# Altium footprint library B105ic.PcbLib: 84 footprints (part 1 of 6)
Each footprint in its own frame and in the unit in brackets; x right, y up, seen from the top. Pads: shape width x height; smd on the part's side, far side on the other; paste and mask are expansions set on the pad; w line width, h text height; cw(c..) or ccw(c..) is an arc to the next point about the centre after c.
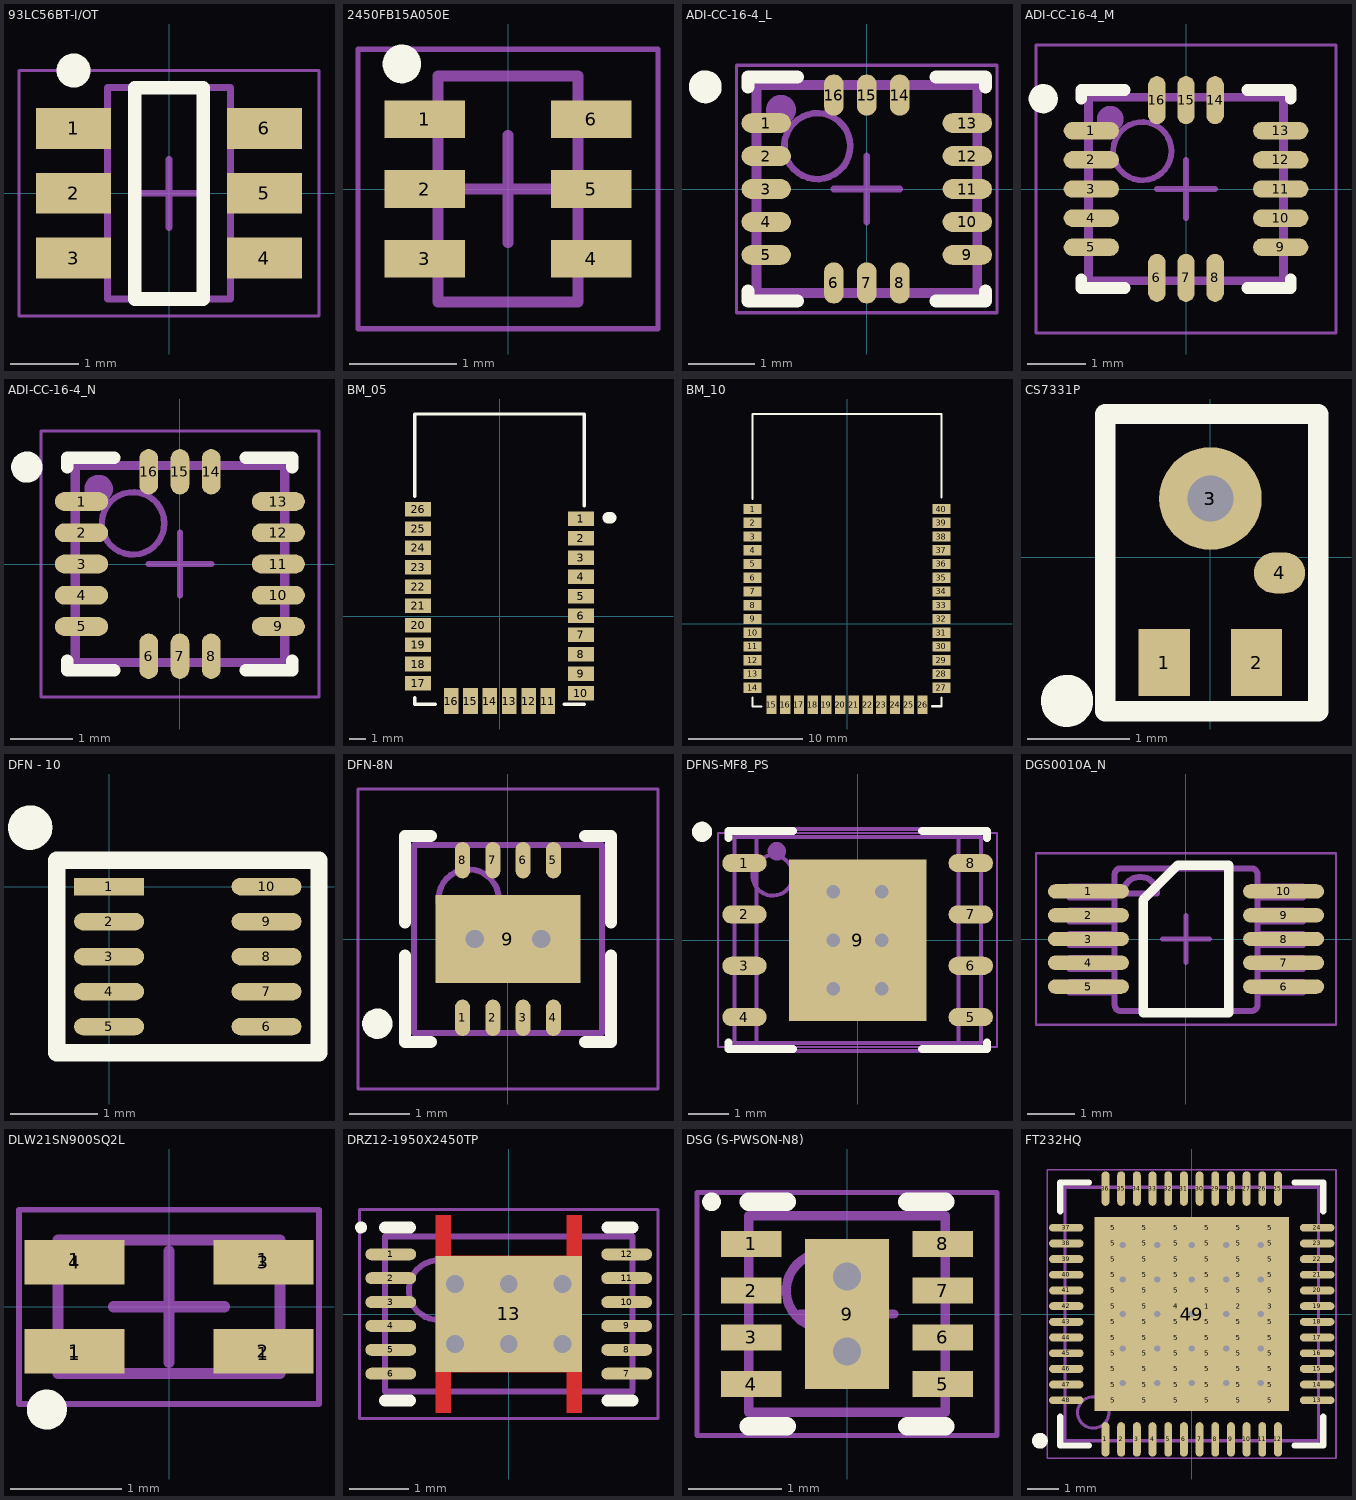
[diagram p0: the footprints below, top view; thin cyan lines are the x and y axes]

## 93LC56BT-I/OT [mm] "SOT23, 6-Leads, Body 2,90x2,70mm, Pitch 0,95mm, IPC Medium Density"
height 1.45
pads (6):
  rect 1.1x0.6 smd: 1(-1.4,0.95) 2(-1.4,0) 3(-1.4,-0.95) 4(1.4,-0.95) 5(1.4,0) 6(1.4,0.95)
Top Overlay:
  circle w0.25: c-1.4,1.8 r0.125
  lines w0.2: -0.5,-1.55 -0.5,1.55 0.5,1.55 0.5,-1.55 -0.5,-1.55
Mechanical 13:
  lines w0.1: -0.9,-1.55 0.9,-1.55 0.9,1.55 -0.9,1.55 -0.9,-1.55
Mechanical 15:
  lines w0.05: -2.2,-1.8 2.2,-1.8 2.2,1.8 -2.2,1.8 -2.2,-1.8
  lines w0.1: -0.5,0 0.5,0 ; 0,-0.5 0,0.5
3D body "93LC56BT-I-OT.step": height 1.45, standoff 0, extent -1.4,-1.45 1.4,1.45

## 2450FB15A050E [mm] "Chip Array, Flat, 6-Leads, Pitch 0,65mm,  Body 2,00x1,25mm,  IPC Medium Density"
height 1.05
pads (6):
  rect 0.75x0.35 smd: 1(-0.775,0.65) 2(-0.775,0) 3(-0.775,-0.65) 4(0.775,-0.65) 5(0.775,0) 6(0.775,0.65)
Top Overlay:
  circle w0.2: c-0.987,1.163 r0.08
Mechanical 13:
  lines w0.1: -0.65,-1.05 -0.65,1.05 0.65,1.05 0.65,-1.05 -0.65,-1.05
Mechanical 15:
  lines w0.05: -1.395,-1.3 -1.395,1.3 1.395,1.3 1.395,-1.3 -1.395,-1.3
  lines w0.1: -0.5,0 0.5,0 ; 0,-0.5 0,0.5
3D body "2450FB15A050E.step": height 0.8, standoff 0, extent -0.625,-1 0.625,1

## ADI-CC-16-4_L [mm] "QFN, 16-Leads, Body 3.25x3mm, Pitch 0.5mm, IPC High Density"
height 1.14
pads (16):
  oval 0.75x0.3 smd: 1(-1.525,1) 2(-1.525,0.5) 3(-1.525,0) 4(-1.525,-0.5) 5(-1.525,-1) 9(1.525,-1) 10(1.525,-0.5) 11(1.525,0) 12(1.525,0.5) 13(1.525,1)
  oval 0.3x0.625 smd: 6(-0.5,-1.425) 7(0,-1.425) 8(0.5,-1.425) 14(0.5,1.425) 15(0,1.425) 16(-0.5,1.425)
Top Overlay:
  circle w0.25: c-2.45,1.55 r0.125
  lines w0.2: -1.8,-1.55 -1.8,-1.7 -1.05,-1.7 ; -1.8,1.55 -1.8,1.7 -1.05,1.7 ; 1.05,-1.7 1.8,-1.7 1.8,-1.55 ; 1.05,1.7 1.8,1.7 1.8,1.55
Mechanical 5:
  circle w0.254: c-1.3,1.2 r0.1
  lines w0.1: -1.7,-1.6 1.7,-1.6 1.7,1.6 -1.7,1.6 -1.7,-1.6
  text ".Designator" at -0.9,-0.3 h0.64
Mechanical 13:
  circle w0.1: c-0.75,0.65 r0.5
  lines w0.1: -1.65,-1.55 1.65,-1.55 1.65,1.55 -1.65,1.55 -1.65,-1.55
Mechanical 15:
  lines w0.05: -1.975,-1.875 1.975,-1.875 1.975,1.875 -1.975,1.875 -1.975,-1.875
  lines w0.1: -0.5,0 0.5,0 ; 0,-0.5 0,0.5
3D body: height 1.14, standoff 0, extent -1.65,-1.55 1.65,1.55

## ADI-CC-16-4_M [mm] "QFN, 16-Leads, Body 3.25x3mm, Pitch 0.5mm, IPC Low Density"
height 1.14
pads (16):
  oval 0.95x0.3 smd: 1(-1.625,1) 2(-1.625,0.5) 3(-1.625,0) 4(-1.625,-0.5) 5(-1.625,-1) 9(1.625,-1) 10(1.625,-0.5) 11(1.625,0) 12(1.625,0.5) 13(1.625,1)
  oval 0.3x0.825 smd: 6(-0.5,-1.525) 7(0,-1.525) 8(0.5,-1.525) 14(0.5,1.525) 15(0,1.525) 16(-0.5,1.525)
Top Overlay:
  circle w0.25: c-2.45,1.55 r0.125
  lines w0.2: -1.8,-1.55 -1.8,-1.7 -1.05,-1.7 ; -1.8,1.55 -1.8,1.7 -1.05,1.7 ; 1.05,-1.7 1.8,-1.7 1.8,-1.55 ; 1.05,1.7 1.8,1.7 1.8,1.55
Mechanical 5:
  circle w0.254: c-1.3,1.2 r0.1
  lines w0.1: -1.7,-1.6 1.7,-1.6 1.7,1.6 -1.7,1.6 -1.7,-1.6
  text ".Designator" at -0.9,-0.3 h0.64
Mechanical 13:
  circle w0.1: c-0.75,0.65 r0.5
  lines w0.1: -1.65,-1.55 -1.65,1.55 1.65,1.55 1.65,-1.55 -1.65,-1.55
Mechanical 15:
  lines w0.05: -2.575,-2.475 -2.575,2.475 2.575,2.475 2.575,-2.475 -2.575,-2.475
  lines w0.1: -0.5,0 0.5,0 ; 0,-0.5 0,0.5
3D body: height 1.14, standoff 0, extent -1.65,-1.55 1.65,1.55

## ADI-CC-16-4_N [mm]
pads (16):
  oval 0.85x0.3 smd: 1(-1.575,1) 2(-1.575,0.5) 3(-1.575,0) 4(-1.575,-0.5) 5(-1.575,-1) 9(1.575,-1) 10(1.575,-0.5) 11(1.575,0) 12(1.575,0.5) 13(1.575,1)
  oval 0.3x0.725 smd: 6(-0.5,-1.475) 7(0,-1.475) 8(0.5,-1.475) 14(0.5,1.475) 15(0,1.475) 16(-0.5,1.475)
Top Overlay:
  circle w0.25: c-2.45,1.55 r0.125
  lines w0.2: -1.8,-1.55 -1.8,-1.7 -1.05,-1.7 ; -1.8,1.55 -1.8,1.7 -1.05,1.7 ; 1.05,-1.7 1.8,-1.7 1.8,-1.55 ; 1.05,1.7 1.8,1.7 1.8,1.55
Mechanical 5:
  circle w0.254: c-1.3,1.2 r0.1
  lines w0.1: -1.7,-1.6 -1.7,1.6 1.7,1.6 1.7,-1.6 -1.7,-1.6
  text ".Designator" at 0.7,0.2 h0.64
Mechanical 13:
  circle w0.1: c-0.75,0.65 r0.5
  lines w0.1: -1.65,-1.55 1.65,-1.55 1.65,1.55 -1.65,1.55 -1.65,-1.55
Mechanical 15:
  lines w0.05: -2.225,-2.125 2.225,-2.125 2.225,2.125 -2.225,2.125 -2.225,-2.125
  lines w0.1: -0.5,0 0.5,0 ; 0,-0.5 0,0.5
3D body: height 1.14, standoff 0, extent -1.65,-1.55 1.65,1.55

## BM_05 [mm] "Bluetooth module"
pads (26):
  rect 1.6x0.9 smd: 1(5.05,6.05) 2(5.05,4.85) 3(5.05,3.65) 4(5.05,2.45) 5(5.05,1.25) 6(5.05,0.05) 7(5.05,-1.15) 8(5.05,-2.35) 9(5.05,-3.55) 10(5.05,-4.75) 17(-5.05,-4.15) 18(-5.05,-2.95) 19(-5.05,-1.75) 20(-5.05,-0.55) 21(-5.05,0.65) 22(-5.05,1.85) 23(-5.05,3.05) 24(-5.05,4.25) 25(-5.05,5.45) 26(-5.05,6.65)
  rect 0.9x1.6 smd: 11(3,-5.25) 12(1.8,-5.25) 13(0.6,-5.25) 14(-0.6,-5.25) 15(-1.8,-5.25) 16(-3,-5.25)
Top Overlay:
  lines w0.2: -5.25,-5.025 -5.25,-5.45 -3.975,-5.45 ; -5.25,7.45 -5.25,12.55 5.25,12.55 5.25,6.85 ; 4,-5.45 5.25,-5.45
  lines w0.7: 6.725,6.125 6.9,6.125

## BM_10 [mm] "Bluetooth module"
pads (40):
  rect 1.6x0.9 smd: 1(-8.25,10) 2(-8.25,8.8) 3(-8.25,7.6) 4(-8.25,6.4) 5(-8.25,5.2) 6(-8.25,4) 7(-8.25,2.8) 8(-8.25,1.6) 9(-8.25,0.4) 10(-8.25,-0.8) 11(-8.25,-2) 12(-8.25,-3.2) 13(-8.25,-4.4) 14(-8.25,-5.6) 27(8.25,-5.6) 28(8.25,-4.4) 29(8.25,-3.2) 30(8.25,-2) 31(8.25,-0.8) 32(8.25,0.4) 33(8.25,1.6) 34(8.25,2.8) 35(8.25,4) 36(8.25,5.2) 37(8.25,6.4) 38(8.25,7.6) 39(8.25,8.8) 40(8.25,10)
  rect 0.9x1.6 smd: 15(-6.6,-7.1) 16(-5.4,-7.1) 17(-4.2,-7.1) 18(-3,-7.1) 19(-1.8,-7.1) 20(-0.6,-7.1) 21(0.6,-7.1) 22(1.8,-7.1) 23(3,-7.1) 24(4.2,-7.1) 25(5.4,-7.1) 26(6.6,-7.1)
Top Overlay:
  lines w0.2: -8.25,-6.45 -8.25,-7.25 -7.475,-7.25 ; -8.25,10.9 -8.25,18.3 8.25,18.3 8.25,11.025 ; 7.45,-7.225 8.25,-7.225 8.25,-6.45

## CS7331P [mm]
pads (5):
  rect 0.5x0.65 smd mask+0.08: 1(-0.45,-1.025) 2(0.45,-1.025)
  round 1 smd: 3(0,0.575)
  round 0.65 hole 0.45: 3(0,0.575)
  oval 0.5x0.4 smd mask+0.08: 4(0.674,-0.15)
Top Overlay:
  circle w0.254: c-1.4,-1.4 r0.127
  lines w0.2: -1.025,1.4 -1.025,-1.5 1.05,-1.5 ; -1.025,1.4 -0.506,1.4 0.531,1.4 1.05,1.4 ; -1.025,1.4 -1.025,1.4 ; 1.05,-1.5 1.05,-1.5 ; 1.05,-1.5 1.05,1.4 ; 1.05,1.4 1.05,1.4
3D body: height 0.9, standoff 0, extent -0.875,-1.325 0.875,1.25

## DFN - 10 [mm]
pads (10):
  rect 0.8x0.2 smd mask+0.08: 1(0,0)
  oval 0.8x0.2 smd mask+0.08: 2(0,-0.4) 3(0,-0.8) 4(0,-1.2) 5(0,-1.6) 6(1.8,-1.6) 7(1.8,-1.2) 8(1.8,-0.8) 9(1.8,-0.4) 10(1.8,0)
Top Overlay:
  circle w0.254: c-0.902,0.675 r0.127
  lines w0.2: -0.6,-1.9 -0.6,0.3 2.4,0.3 2.4,-1.9 -0.6,-1.9
3D body "DFN 8-2x2.step": height 0.75, standoff -0.05, extent -0.076,-1.8 1.926,0.2

## DFN-8N [mm] "3mmx3mm"
height 0.8
pads (9):
  oval 0.25x0.6 smd: 1(-0.75,-1.3) 2(-0.25,-1.3) 3(0.25,-1.3) 4(0.75,-1.3) 5(0.75,1.3) 6(0.25,1.3) 7(-0.25,1.3) 8(-0.75,1.3)
  rect 2.4x1.45 smd: 9(0,0)
via 0.55,0 diameter 0.5 hole 0.3
via -0.55,0 diameter 0.5 hole 0.3
Top Overlay:
  circle w0.25: c-2.157,-1.397 r0.125
  lines w0.2: -1.7,-0.275 -1.7,-1.7 -1.275,-1.7 ; -1.7,0.275 -1.7,1.7 -1.275,1.7 ; 1.275,-1.7 1.7,-1.7 1.7,-0.275 ; 1.275,1.7 1.7,1.7 1.7,0.275
Mechanical 13:
  circle w0.1: c-0.65,0.65 r0.5
  lines w0.1: -1.55,-1.55 1.55,-1.55 1.55,1.55 -1.55,1.55 -1.55,-1.55
Mechanical 15:
  lines w0.05: -2.475,-2.475 2.475,-2.475 2.475,2.475 -2.475,2.475 -2.475,-2.475
  lines w0.1: -0.5,0 0.5,0 ; 0,-0.5 0,0.5
3D body "DFN-8.step": height 0.8, standoff 0, extent -1.5,-1.51 1.5,1.51

## DFNS-MF8_PS [mm]
pads (9):
  oval 1.1x0.45 smd: 1(-2.8,1.905) 2(-2.8,0.635) 3(-2.8,-0.635) 4(-2.8,-1.905) 5(2.8,-1.905) 6(2.8,-0.635) 7(2.8,0.635) 8(2.8,1.905)
  rect 3.4x4 smd paste-2: 9(0,0)
via -0.6,1.2 diameter 0.66 hole 0.33
via 0.6,1.2 diameter 0.66 hole 0.33
via -0.6,0 diameter 0.66 hole 0.33
via 0.6,0 diameter 0.66 hole 0.33
via -0.6,-1.2 diameter 0.66 hole 0.33
via 0.6,-1.2 diameter 0.66 hole 0.33
Top Overlay:
  circle w0.25: c-3.85,2.68 r0.125
  lines w0.2: -3.2,-2.53 -3.2,-2.7 -1.6,-2.7 ; -3.2,2.53 -3.2,2.7 -1.6,2.7 ; 1.6,-2.7 3.2,-2.7 3.2,-2.53 ; 1.6,2.7 3.2,2.7 3.2,2.53
Top Paste:
  region: -0.18,1.64 -1.34,1.64 -1.34,0.18 -0.18,0.18
  rectangle: 0.18,-1.64 1.34,-0.18
  region: -0.18,-0.18 -1.34,-0.18 -1.34,-1.64 -0.18,-1.64
  rectangle: 0.18,0.18 1.34,1.64
Mechanical 5:
  circle w0.254: c-2,2.2 r0.1
  lines w0.1: -2.5,-2.75 -2.5,2.75 2.5,2.75 2.5,-2.75 -2.5,-2.75
  text ".Designator" at -0.8,1.7 h1.5
Mechanical 13:
  circle w0.1: c-2.1,1.6 r0.5
  lines w0.1: -3.05,-2.55 3.05,-2.55 3.05,2.55 -3.05,2.55 -3.05,-2.55
Mechanical 15:
  lines w0.05: -3.45,-2.65 -3.45,2.65 3.45,2.65 3.45,-2.65 -3.45,-2.65
  lines w0.1: -0.5,0 0.5,0 ; 0,-0.5 0,0.5
3D body: height 1, standoff 0, extent -3.05,-2.55 3.05,2.55

## DGS0010A_N [mm]
pads (10):
  oval 1.7x0.3 smd mask+0.025: 1(-2.05,1) 2(-2.05,0.5) 3(-2.05,0) 4(-2.05,-0.5) 5(-2.05,-1) 6(2.05,-1) 7(2.05,-0.5) 8(2.05,0) 9(2.05,0.5) 10(2.05,1)
Top Overlay:
  lines w0.2: -0.9,-1.55 0.9,-1.55 0.9,1.55 -0.175,1.55 -0.9,0.825 -0.9,-1.55
Mechanical 5:
  lines w0.127: -2.45,-1.128 -2.45,-0.899 -2.21,-0.899 -2.09,-0.899 -2.087,-0.899 -1.784,-0.899 -1.498,-0.899 -1.498,-1.128 -1.784,-1.128 -2.087,-1.128 -2.09,-1.128 -2.21,-1.128 -2.45,-1.128 ; -2.45,-0.628 -2.45,-0.4 -2.21,-0.4 -2.09,-0.4 -2.087,-0.4 -1.784,-0.4 -1.498,-0.4 -1.498,-0.628 -1.784,-0.628 -2.087,-0.628 -2.09,-0.628 -2.21,-0.628 -2.45,-0.628 ; -2.45,-0.128 -2.45,0.1 -2.21,0.1 -2.09,0.1 -2.087,0.1 -1.784,0.1 -1.498,0.1 -1.498,-0.128 -1.784,-0.128 -2.087,-0.128 -2.09,-0.128 -2.21,-0.128 -2.45,-0.128 ; -2.45,0.372 -2.45,0.6 -2.21,0.6 -2.09,0.6 -2.087,0.6 -1.784,0.6 -1.498,0.6 -1.498,0.372 -1.784,0.372 -2.087,0.372 -2.09,0.372 -2.21,0.372 -2.45,0.372 ; -2.45,0.871 -2.45,1.1 -2.21,1.1 -2.09,1.1 -2.087,1.1 -1.784,1.1 -1.498,1.1 -1.498,0.871 -1.784,0.871 -2.087,0.871 -2.09,0.871 -2.21,0.871 -2.45,0.871 ; -1.497,-1.388 ccw(c-1.37,-1.386) -1.373,-1.513 -1.371,-1.513 1.373,-1.513 1.375,-1.513 ccw(c1.373,-1.386) 1.5,-1.388 1.5,-1.386 1.5,1.358 1.5,1.36 ccw(c1.373,1.358) 1.375,1.485 1.373,1.485 -1.371,1.485 -1.373,1.485 ccw(c-1.37,1.358) -1.497,1.36 -1.498,1.358 -1.498,-1.386 -1.497,-1.388 ; -1.32,0.951 cw(c-0.964,0.951) -0.609,0.951 -1.32,0.951 ; 1.5,-1.128 1.5,-0.899 1.786,-0.899 2.089,-0.899 2.093,-0.899 2.213,-0.899 2.452,-0.899 2.452,-1.128 2.213,-1.128 2.093,-1.128 2.089,-1.128 1.786,-1.128 1.5,-1.128 ; 1.5,-0.628 1.5,-0.4 1.786,-0.4 2.089,-0.4 2.093,-0.4 2.213,-0.4 2.452,-0.4 2.452,-0.628 2.213,-0.628 2.093,-0.628 2.089,-0.628 1.786,-0.628 1.5,-0.628 ; 1.5,-0.128 1.5,0.1 1.786,0.1 2.089,0.1 2.093,0.1 2.213,0.1 2.452,0.1 2.452,-0.128 2.213,-0.128 2.093,-0.128 2.089,-0.128 1.786,-0.128 1.5,-0.128 ; 1.5,0.372 1.5,0.6 1.786,0.6 2.089,0.6 2.093,0.6 2.213,0.6 2.452,0.6 2.452,0.372 2.213,0.372 2.093,0.372 2.089,0.372 1.786,0.372 1.5,0.372 ; 1.5,0.871 1.5,1.1 1.786,1.1 2.089,1.1 2.093,1.1 2.213,1.1 2.452,1.1 2.452,0.871 2.213,0.871 2.093,0.871 2.089,0.871 1.786,0.871 1.5,0.871
  text ".Designator" at 0.4,-0.8 h0.64
Mechanical 13:
  lines w0.127: -2.45,-1.128 -2.21,-1.128 -2.09,-1.128 -2.087,-1.128 -1.784,-1.128 -1.498,-1.128 -1.498,-0.899 -1.784,-0.899 -2.087,-0.899 -2.09,-0.899 -2.21,-0.899 -2.45,-0.899 -2.45,-1.128 ; -2.45,-0.628 -2.21,-0.628 -2.09,-0.628 -2.087,-0.628 -1.784,-0.628 -1.498,-0.628 -1.498,-0.4 -1.784,-0.4 -2.087,-0.4 -2.09,-0.4 -2.21,-0.4 -2.45,-0.4 -2.45,-0.628 ; -2.45,-0.128 -2.21,-0.128 -2.09,-0.128 -2.087,-0.128 -1.784,-0.128 -1.498,-0.128 -1.498,0.1 -1.784,0.1 -2.087,0.1 -2.09,0.1 -2.21,0.1 -2.45,0.1 -2.45,-0.128 ; -2.45,0.372 -2.21,0.372 -2.09,0.372 -2.087,0.372 -1.784,0.372 -1.498,0.372 -1.498,0.6 -1.784,0.6 -2.087,0.6 -2.09,0.6 -2.21,0.6 -2.45,0.6 -2.45,0.372 ; -2.45,0.871 -2.21,0.871 -2.09,0.871 -2.087,0.871 -1.784,0.871 -1.498,0.871 -1.498,1.1 -1.784,1.1 -2.087,1.1 -2.09,1.1 -2.21,1.1 -2.45,1.1 -2.45,0.871 ; -1.497,-1.388 ccw(c-1.37,-1.386) -1.373,-1.513 -1.371,-1.513 1.373,-1.513 1.375,-1.513 ccw(c1.373,-1.386) 1.5,-1.388 1.5,-1.386 1.5,1.358 1.5,1.36 ccw(c1.373,1.358) 1.375,1.485 1.373,1.485 -1.371,1.485 -1.373,1.485 ccw(c-1.37,1.358) -1.497,1.36 -1.498,1.358 -1.498,-1.386 -1.497,-1.388 ; -1.32,0.951 cw(c-0.964,0.951) -0.609,0.951 -1.32,0.951 ; 1.5,-1.128 1.786,-1.128 2.089,-1.128 2.093,-1.128 2.213,-1.128 2.452,-1.128 2.452,-0.899 2.213,-0.899 2.093,-0.899 2.089,-0.899 1.786,-0.899 1.5,-0.899 1.5,-1.128 ; 1.5,-0.628 1.786,-0.628 2.089,-0.628 2.093,-0.628 2.213,-0.628 2.452,-0.628 2.452,-0.4 2.213,-0.4 2.093,-0.4 2.089,-0.4 1.786,-0.4 1.5,-0.4 1.5,-0.628 ; 1.5,-0.128 1.786,-0.128 2.089,-0.128 2.093,-0.128 2.213,-0.128 2.452,-0.128 2.452,0.1 2.213,0.1 2.093,0.1 2.089,0.1 1.786,0.1 1.5,0.1 1.5,-0.128 ; 1.5,0.372 1.786,0.372 2.089,0.372 2.093,0.372 2.213,0.372 2.452,0.372 2.452,0.6 2.213,0.6 2.093,0.6 2.089,0.6 1.786,0.6 1.5,0.6 1.5,0.372 ; 1.5,0.871 1.786,0.871 2.089,0.871 2.093,0.871 2.213,0.871 2.452,0.871 2.452,1.1 2.213,1.1 2.093,1.1 2.089,1.1 1.786,1.1 1.5,1.1 1.5,0.871
Mechanical 15:
  lines w0.05: -3.15,-1.8 3.15,-1.8 3.15,1.8 -3.15,1.8 -3.15,-1.8
  lines w0.1: -0.5,0 0.5,0 ; 0,-0.5 0,0.5
3D body "DGS0010AakaMUB10A.stp": height 0.94, standoff -0.02, extent -2.451,-1.499 2.451,1.499

## DLW21SN900SQ2L [mm] "DFN, 4-Leads, Body 1,20x2,00mm, Pitch 1,55mm, 0805, IPC Medium Density"
height 1.4
pads (8):
  rect 0.9x0.35 on Top Paste: 1(-0.85,-0.425) 1(-0.85,0.425) 1(0.85,-0.425) 1(0.85,0.425)
  rect 0.9x0.4 smd paste-0.2: 1(-0.85,-0.4) 2(0.85,-0.4) 3(0.85,0.4) 4(-0.85,0.4)
Top Overlay:
  circle w0.2: c-1.1,-0.925 r0.08
Mechanical 13:
  lines w0.1: -1,-0.6 1,-0.6 1,0.6 -1,0.6 -1,-0.6
Mechanical 15:
  lines w0.05: -1.35,-0.875 1.35,-0.875 1.35,0.875 -1.35,0.875 -1.35,-0.875
  lines w0.1: -0.5,0 0.5,0 ; 0,-0.5 0,0.5
3D body "DLW21SN900SQ2L.step": height 1.2, standoff 0, extent -1,-0.6 1,0.6

## DRZ12-1950X2450TP [mm] "SON, 12-Leads, Body 4x2.5mm, Pitch 0.4mm, Thermal Pad 1.95x2.45mm, TI Recommended"
height 1
pads (13):
  oval 0.85x0.2 smd paste-0.1 mask+0.05: 1(-1.975,1) 2(-1.975,0.6) 3(-1.975,0.2) 4(-1.975,-0.2) 5(-1.975,-0.6) 6(-1.975,-1) 7(1.975,-1) 8(1.975,-0.6) 9(1.975,-0.2) 10(1.975,0.2) 11(1.975,0.6) 12(1.975,1)
  rect 2.45x1.95 smd paste-0.975 mask+0.05: 13(0,0)
via 0.9,-0.5 diameter 0.5 hole 0.3
via 0.9,0.5 diameter 0.5 hole 0.3
via -0.9,0.5 diameter 0.5 hole 0.3
via 0,0.5 diameter 0.5 hole 0.3
via -0.9,-0.5 diameter 0.5 hole 0.3
via 0,-0.5 diameter 0.5 hole 0.3
Top Layer:
  region: -1.225,-1.65 -1.225,1.65 -0.975,1.65 -0.975,0.975 0.975,0.975 0.975,1.65 1.225,1.65 1.225,-1.65 0.975,-1.65 0.975,-0.975 -0.975,-0.975 -0.975,-1.65
Top Overlay:
  circle w0.1: c-2.475,1.45 r0.05
  lines w0.2: -2.075,-1.45 -1.65,-1.45 ; -2.075,1.45 -1.65,1.45 ; 1.65,-1.45 2.075,-1.45 ; 1.65,1.45 2.075,1.45
Top Paste:
  rectangle: -1.1,0.1 -0.1,0.9
  region: 1.1,0.9 0.1,0.9 0.1,0.1 1.1,0.1
  region: 1.1,-0.1 0.1,-0.1 0.1,-0.9 1.1,-0.9
  rectangle: -1.1,-0.9 -0.1,-0.1
  rectangle: -1.225,1.1 -0.975,1.625
  rectangle: -1.225,-1.625 -0.975,-1.1
  region: 1.225,-1.1 0.975,-1.1 0.975,-1.625 1.225,-1.625
  region: 1.225,1.625 0.975,1.625 0.975,1.1 1.225,1.1
  lines w0.2: -2.275,-1 -1.675,-1 ; -2.275,-0.6 -1.675,-0.6 ; -2.275,-0.2 -1.675,-0.2 ; -2.275,0.2 -1.675,0.2 ; -2.275,0.6 -1.675,0.6 ; -2.275,1 -1.675,1 ; 1.675,-1 2.275,-1 ; 1.675,-0.6 2.275,-0.6 ; 1.675,-0.2 2.275,-0.2 ; 1.675,0.2 2.275,0.2 ; 1.675,0.6 2.275,0.6 ; 1.675,1 2.275,1
Mechanical 13:
  circle w0.1: c-1.175,0.4 r0.5
  lines w0.1: -2.075,-1.3 -2.075,1.3 2.075,1.3 2.075,-1.3 -2.075,-1.3
Mechanical 15:
  lines w0.05: -2.5,-1.75 -2.5,1.75 2.5,1.75 2.5,-1.75 -2.5,-1.75
  lines w0.1: -0.5,0 0.5,0 ; 0,-0.5 0,0.5
3D body "User Library-SON-12-2.step": height 1, standoff -0.05, extent -2.075,-1.3 2.075,1.3

## DSG (S-PWSON-N8) [mm] "SON, 8-Leads, Body 2,00x2,00mm, Pitch 0,50mm, Thermal Pad 1,60x0,69mm, IPC Medium Density"
height 0.8
pads (9):
  rect 0.65x0.28 smd paste-0.015 mask+0.07: 1(-1.025,0.75) 2(-1.025,0.25) 3(-1.025,-0.25) 4(-1.025,-0.75) 5(1.025,-0.75) 6(1.025,-0.25) 7(1.025,0.25) 8(1.025,0.75)
  rect 0.9x1.6 smd paste-0.15 mask+0.07: 9(0,0)
via 0,-0.4 diameter 0.5 hole 0.3
via 0,0.4 diameter 0.5 hole 0.3
Top Overlay:
  circle w0.1: c-1.45,1.2 r0.05
  lines w0.2: -1.05,-1.2 -0.645,-1.2 ; -1.05,1.2 -0.645,1.2 ; 0.645,-1.2 1.05,-1.2 ; 0.645,1.2 1.05,1.2
Mechanical 13:
  circle w0.1: c-0.25,0.25 r0.4
  lines w0.1: -1.05,-1.05 1.05,-1.05 1.05,1.05 -1.05,1.05 -1.05,-1.05
Mechanical 15:
  lines w0.05: -1.605,-1.3 1.605,-1.3 1.605,1.3 -1.605,1.3 -1.605,-1.3
  lines w0.1: -0.5,0 0.5,0 ; 0,-0.5 0,0.5
3D body "DSG (S-PWSON-N8).step": height 0.8, standoff 0, extent -1.05,-1.05 1.05,1.05

## FT232HQ [mm] "QFN, 48-Leads, Body 8,00x8,00mm, Pitch 0,50mm, Thermal Pad 5,60x5,60mm, IPC Medium Density"
height 0.9
pads (121):
  oval 0.25x1.1 smd: 1(-2.75,-4) 2(-2.25,-4) 3(-1.75,-4) 4(-1.25,-4) 5(-0.75,-4) 6(-0.25,-4) 7(0.25,-4) 8(0.75,-4) 9(1.25,-4) 10(1.75,-4) 11(2.25,-4) 12(2.75,-4) 25(2.75,4) 26(2.25,4) 27(1.75,4) 28(1.25,4) 29(0.75,4) 30(0.25,4) 31(-0.25,4) 32(-0.75,4) 33(-1.25,4) 34(-1.75,4) 35(-2.25,4) 36(-2.75,4)
  rect 0.6x0.3 on Top Paste: 1(0.5,0.25) 2(1.5,0.25) 3(2.5,0.25) 4(-0.5,0.25) 5(-2.5,-2.75) 5(-2.5,-2.25) 5(-2.5,-1.75) 5(-2.5,-1.25) 5(-2.5,-0.75) 5(-2.5,-0.25) 5(-2.5,0.25) 5(-2.5,0.75) 5(-2.5,1.25) 5(-2.5,1.75) 5(-2.5,2.25) 5(-2.5,2.75) 5(-1.5,-2.75) 5(-1.5,-2.25) 5(-1.5,-1.75) 5(-1.5,-1.25) 5(-1.5,-0.75) 5(-1.5,-0.25) 5(-1.5,0.25) 5(-1.5,0.75) 5(-1.5,1.25) 5(-1.5,1.75) 5(-1.5,2.25) 5(-1.5,2.75) 5(-0.5,-2.75) 5(-0.5,-2.25) 5(-0.5,-1.75) 5(-0.5,-1.25) 5(-0.5,-0.75) 5(-0.5,-0.25) 5(-0.5,0.75) 5(-0.5,1.25) 5(-0.5,1.75) 5(-0.5,2.25) 5(-0.5,2.75) 5(0.5,-2.75) 5(0.5,-2.25) 5(0.5,-1.75) 5(0.5,-1.25) 5(0.5,-0.75) 5(0.5,-0.25) 5(0.5,0.75) 5(0.5,1.25) 5(0.5,1.75) 5(0.5,2.25) 5(0.5,2.75) 5(1.5,-2.75) 5(1.5,-2.25) 5(1.5,-1.75) 5(1.5,-1.25) 5(1.5,-0.75) 5(1.5,-0.25) 5(1.5,0.75) 5(1.5,1.25) 5(1.5,1.75) 5(1.5,2.25) 5(1.5,2.75) 5(2.5,-2.75) 5(2.5,-2.25) 5(2.5,-1.75) 5(2.5,-1.25) 5(2.5,-0.75) 5(2.5,-0.25) 5(2.5,0.75) 5(2.5,1.25) 5(2.5,1.75) 5(2.5,2.25) 5(2.5,2.75)
  oval 1.1x0.25 smd: 13(4,-2.75) 14(4,-2.25) 15(4,-1.75) 16(4,-1.25) 17(4,-0.75) 18(4,-0.25) 19(4,0.25) 20(4,0.75) 21(4,1.25) 22(4,1.75) 23(4,2.25) 24(4,2.75) 37(-4,2.75) 38(-4,2.25) 39(-4,1.75) 40(-4,1.25) 41(-4,0.75) 42(-4,0.25) 43(-4,-0.25) 44(-4,-0.75) 45(-4,-1.25) 46(-4,-1.75) 47(-4,-2.25) 48(-4,-2.75)
  rect 6.2x6.2 smd paste-3.1: 49(0,0)
via -2.2,2.2 diameter 0.5 hole 0.2
via -1.1,2.2 diameter 0.5 hole 0.2
via 0,2.2 diameter 0.5 hole 0.2
via 1.1,2.2 diameter 0.5 hole 0.2
via 2.2,2.2 diameter 0.5 hole 0.2
via -2.2,1.1 diameter 0.5 hole 0.2
via -1.1,1.1 diameter 0.5 hole 0.2
via 0,1.1 diameter 0.5 hole 0.2
via 1.1,1.1 diameter 0.5 hole 0.2
via 2.2,1.1 diameter 0.5 hole 0.2
via -2.2,0 diameter 0.5 hole 0.2
via -1.1,0 diameter 0.5 hole 0.2
via 0,0 diameter 0.5 hole 0.2
via 1.1,0 diameter 0.5 hole 0.2
via 2.2,0 diameter 0.5 hole 0.2
via -2.2,-1.1 diameter 0.5 hole 0.2
via -1.1,-1.1 diameter 0.5 hole 0.2
via 0,-1.1 diameter 0.5 hole 0.2
via 1.1,-1.1 diameter 0.5 hole 0.2
via 2.2,-1.1 diameter 0.5 hole 0.2
via -2.2,-2.2 diameter 0.5 hole 0.2
via -1.1,-2.2 diameter 0.5 hole 0.2
via 0,-2.2 diameter 0.5 hole 0.2
via 1.1,-2.2 diameter 0.5 hole 0.2
via 2.2,-2.2 diameter 0.5 hole 0.2
Top Overlay:
  circle w0.25: c-4.84,-4.04 r0.125
  lines w0.2: -4.19,-3.275 -4.19,-4.19 -3.275,-4.19 ; -4.19,3.275 -4.19,4.19 -3.275,4.19 ; 3.275,-4.19 4.19,-4.19 4.19,-3.275 ; 3.275,4.19 4.19,4.19 4.19,3.275
Mechanical 13:
  circle w0.1: c-3.14,-3.14 r0.5
  lines w0.1: -4.04,-4.04 -4.04,4.04 4.04,4.04 4.04,-4.04 -4.04,-4.04
Mechanical 15:
  lines w0.05: -4.6,-4.6 -4.6,4.6 4.6,4.6 4.6,-4.6 -4.6,-4.6
  lines w0.1: -0.5,0 0.5,0 ; 0,-0.5 0,0.5
3D body "FT232HQ.step": height 0.85, standoff -0.05, extent -4.001,-4.001 4.001,4.001